# Altium integrated library ubloxLib.IntLib: 111 symbols (part 4 of 4)
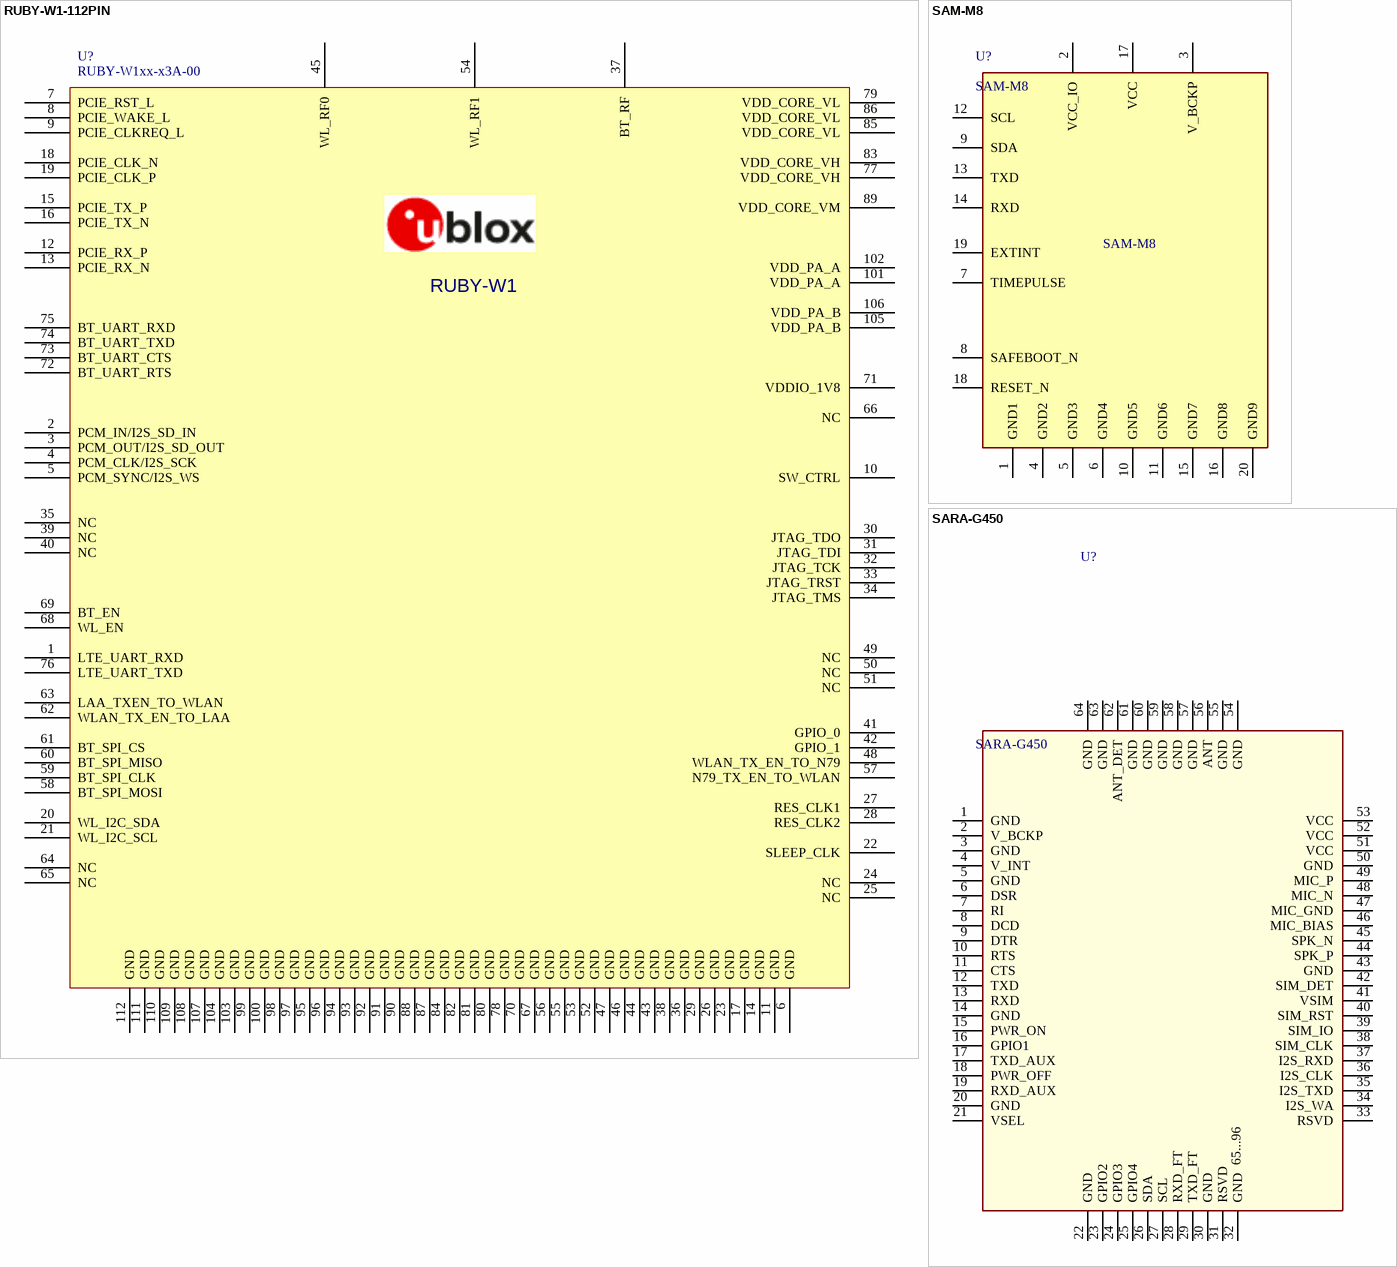
[diagram p27: symbols RUBY-W1-112PIN to SARA-G450]

## RUBY-W1-112PIN
designator U?, comment RUBY-W1xx-x3A-00
LGA-RUBY-W1-112PIN / Host-based automotive module with Wi-Fi 6E and Dual-Mode Bluetooth
footprint RUBY-W1-LGA112PIN (Footrpint for RUBY-W1 - 23.0x23.0 mm)
footprint RUBY-Wx-LGA112PIN_SHARED (Shared footprint for RUBY-W1/RUBY-W2 - 23.0x23.0 mm/23.0x25.0 mm)
pins: 1 LTE_UART_RXD "WSI interface for LTE co-existing interface with LTE modem to enable firmware communication, input signal", 2 PCM_IN/I2S_SD_IN "Bluetooth PCM input signal/I2S_SD_IN,  I2S serial data input", 3 PCM_OUT/I2S_SD_OUT "Bluetooth PCM output signal  Internal 10 kΩ pull-up to VDDIO_1V8 on this pin", 4 PCM_CLK/I2S_SCK "Bluetooth PCM clock signal", 5 PCM_SYNC/I2S_WS "Bluetooth PCM synchronization signal", 6 GND (power), 7 PCIE_RST_L "PCIe host indication to reset the PCIe interface (active low) with weak pull-down", 8 PCIE_WAKE_L "PCIe wake-up signal (active low).   Internal 10 kΩ pull-up to VDDIO_1V8 on this pin", 9 PCIE_CLKREQ_L "PCIe clock request (active low)  Internal 10 kΩ pull-up to VDDIO_1V8 on this pin", 10 SW_CTRL "Switch request to external PMU between active and sleep mode", 11 GND (power), 12 PCIE_RX_P "PCIe positive differential data input", 13 PCIE_RX_N "PCIe negative differential data input", 14 GND (power), 15 PCIE_TX_P "PCIe positive differential data output", 16 PCIE_TX_N "PCIe negative differential data output", 17 GND (power), 18 PCIE_CLK_N "PCIe negative differential clock input", 19 PCIE_CLK_P "PCIe positive differential clock input", 20 WL_I2C_SDA "I2C Master bus Data.   Internal 10 kΩ pull-up to VDDIO_1V8 on this pin.", 21 WL_I2C_SCL "I2C Master bus Clock. The maximum clock rate is 400 kHz. Internal 10 kΩ pull-up to VDDIO_1V8 on this pin.", 22 SLEEP_CLK "External low-power 32.768 kHz clock input. A pull-down resistor is required if SLEEP_CLK is not used.", 23 GND (power), 24 NC, 25 NC, 26 GND (power), 27 RES_CLK1 "Reserved for signal clocking purposes", 28 RES_CLK2 "Reserved for signal clocking purposes", 29 GND (power), 30 JTAG_TDO "JTAG Test Data output. Bootstrap pin, see Table 4 in Datasheet", 31 JTAG_TDI "JTAG Test Data input", 32 JTAG_TCK "JTAG Test Clock", 33 JTAG_TRST "JTAG Test Reset", 34 JTAG_TMS "JTAG Test Mode Select", 35 NC, 36 GND (power), 37 BT_RF "Bluetooth RF input/output (RUBY-W183 only)", 38 GND (power), 39 NC, 40 NC, 41 GPIO_0 "Reserved signal for BSDL purposes  Bootstrap pin, see also Table 4  in Datasheet", 42 GPIO_1 "Reserved signal for BSDL purposes  Bootstrap pin, see also Table 4  in Datasheet", 43 GND (power), 44 GND (power), 45 WL_RF0 "WLAN RF ANT0 input/output for 2.4 GHz, 5/6 GHz (RUBY-W183) and Bluetooth (RUBY-W182)", 46 GND (power), 47 GND (power), 48 WLAN_TX_EN_TO_N79 "5G NR coexistence output signal to indicate 5/6 GHz chains are transmitting above a certain power level, and below a configurable channel frequency", 49 NC, 50 NC, 51 NC, 52 GND (power), 53 GND (power), 54 WL_RF1, 55 GND (power), 56 GND (power), 57 N79_TX_EN_TO_WLAN "5G NR coexistence input signal to indicate when N79 chain is set to transmit above a prescribed RF power", 58 BT_SPI_MOSI "Bluetooth SPI interface   Main Out Sub In (MOSI).  Bootstrap pin, see also Table 4 in Datasheet", 59 BT_SPI_CLK "Bluetooth SPI interface Clock  Internal 10 kΩ pull-up to VDDIO_1V8 on this pin", 60 BT_SPI_MISO "Bluetooth SPI interface  Main In Sub Out (MISO).  Internal 10 kΩ pull-up to VDDIO_1V8 on this pin", 61 BT_SPI_CS "Bluetooth SPI interface Chip select", 62 WLAN_TX_EN_TO_LAA "LTE-LAA coexistence output signal to indicate 5/6GHz chains are transmitting above a certain level", 63 LAA_TXEN_TO_WLAN "LTE-LAA coexistence input signal to indicate when LAA chain is set to transmit above a prescribed RF power", 64 NC, 65 NC, 66 NC, 67 GND (power), 68 WL_EN "WLAN enable signal. Input, active high to enable WLAN operation", 69 BT_EN "Bluetooth enable signal. Input, active high to enable Bluetooth operation", 70 GND (power), 71 VDDIO_1V8 (power) "Voltage for IO, See Table 15 in Datasheet", 72 BT_UART_RTS "Bluetooth UART active-low, request-to-send signal", 73 BT_UART_CTS "Bluetooth UART active-low,  clear-to-send signal", 74 BT_UART_TXD "Bluetooth UART serial data output", 75 BT_UART_RXD "Bluetooth UART serial data input", 76 LTE_UART_TXD "WSI interface for LTE co-existing interface with LTE modem to enable firmware communication, output signal. Bootstrap pin.  See also Table 4 in Datasheet", 77 VDD_CORE_VH (power) "Voltage for Core, high voltage,  See Table 15 in Datasheet", 78 GND (power), 79 VDD_CORE_VL (power) "Voltage for Core, low voltage,  See Table 15 in Datasheet", 80 GND (power), 81 GND (power), 82 GND (power), 83 VDD_CORE_VH (power) "Voltage for Core, high voltage.  See Table 15 in Datasheet", 84 GND (power), 85 VDD_CORE_VL (power) "Voltage for Core, low voltage  See Table 15 in Datasheet", 86 VDD_CORE_VL (power) "Voltage for Core, low voltage  See Table 15 in Datasheet", 87 GND (power), 88 GND (power), 89 VDD_CORE_VM (power) "Voltage for Core, mid voltage.  See Table 15 in Datasheet", 90 GND (power), 91 GND (power), 92 GND (power), 93 GND (power), 94 GND (power), 95 GND (power), 96 GND (power), 97 GND (power), 98 GND (power), 99 GND (power), 100 GND (power), 101 VDD_PA_A (power) "Voltage for PA in module.  See Table 15 in Datasheet", 102 VDD_PA_A (power) "Voltage for PA in module.  See Table 15 in Datasheet", 103 GND (power), 104 GND (power), 105 VDD_PA_B (power) "Voltage for PA in module.  See Table 15 in Datasheet", 106 VDD_PA_B (power) "Voltage for PA in module.  See Table 15 in Datasheet", 107 GND (power), 108 GND (power), 109 GND (power), 110 GND (power), 111 GND (power), 112 GND (power)
text: RUBY-W1

## SAM-M8
designator U?
u-blox SAM GNSS antenna module; Manufacturer: u-blox; Part Description: u-blox SAM GNSS antenna module; Value: SAM-M8
footprint SAM-M8 (ublox SAM antenna module)
pins: 1 GND1, 2 VCC_IO, 3 V_BCKP, 4 GND2, 5 GND3, 6 GND4, 7 TIMEPULSE, 8 SAFEBOOT_N, 9 SDA, 10 GND5, 11 GND6, 12 SCL, 13 TXD, 14 RXD, 15 GND7, 16 GND8, 17 VCC, 18 RESET_N, 19 EXTINT, 20 GND9

## SARA-G450
designator U?
u-blox SARA-RG450 Quad-band GSM/GPRS module; Part Description: GSM/EGPRS/HSPA module; Manufacturer: u-blox; Value: SARA-G450
footprint SARA (GSM/GPRS and GSM/EGPRS/HSPA Cellular Module)
pins: 1 GND, 2 V_BCKP, 3 GND, 4 V_INT, 5 GND, 6 DSR, 7 RI, 8 DCD, 9 DTR, 10 RTS, 11 CTS, 12 TXD, 13 RXD, 14 GND, 15 PWR_ON, 16 GPIO1, 17 TXD_AUX, 18 PWR_OFF, 19 RXD_AUX, 20 GND, 21 VSEL, 22 GND, 23 GPIO2, 24 GPIO3, 25 GPIO4, 26 SDA, 27 SCL, 28 RXD_FT, 29 TXD_FT, 30 GND, 31 RSVD, 32 GND, 33 RSVD, 34 I2S_WA, 35 I2S_TXD, 36 I2S_CLK, 37 I2S_RXD, 38 SIM_CLK, 39 SIM_IO, 40 SIM_RST, 41 VSIM, 42 SIM_DET, 43 GND, 44 SPK_P, 45 SPK_N, 46 MIC_BIAS, 47 MIC_GND, 48 MIC_N, 49 MIC_P, 50 GND, 51 VCC, 52 VCC, 53 VCC, 54 GND, 55 GND, 56 ANT, 57 GND, 58 GND, 59 GND, 60 GND, 61 GND, 62 ANT_DET, 63 GND, 64 GND, 65 GND, 66 GND, 67 GND, 68 GND, 69 GND, 70 GND, 71 GND, 72 GND, 73 GND, 74 GND, 75 GND, 76 GND, 77 GND, 78 GND, 79 GND, 80 GND, 81 GND, 82 GND, 83 GND, 84 GND, 85 GND, 86 GND, 87 GND, 88 GND, 89 GND, 90 GND, 91 GND, 92 GND, 93 GND, 94 GND, 95 GND, 96 GND
text: 65...96

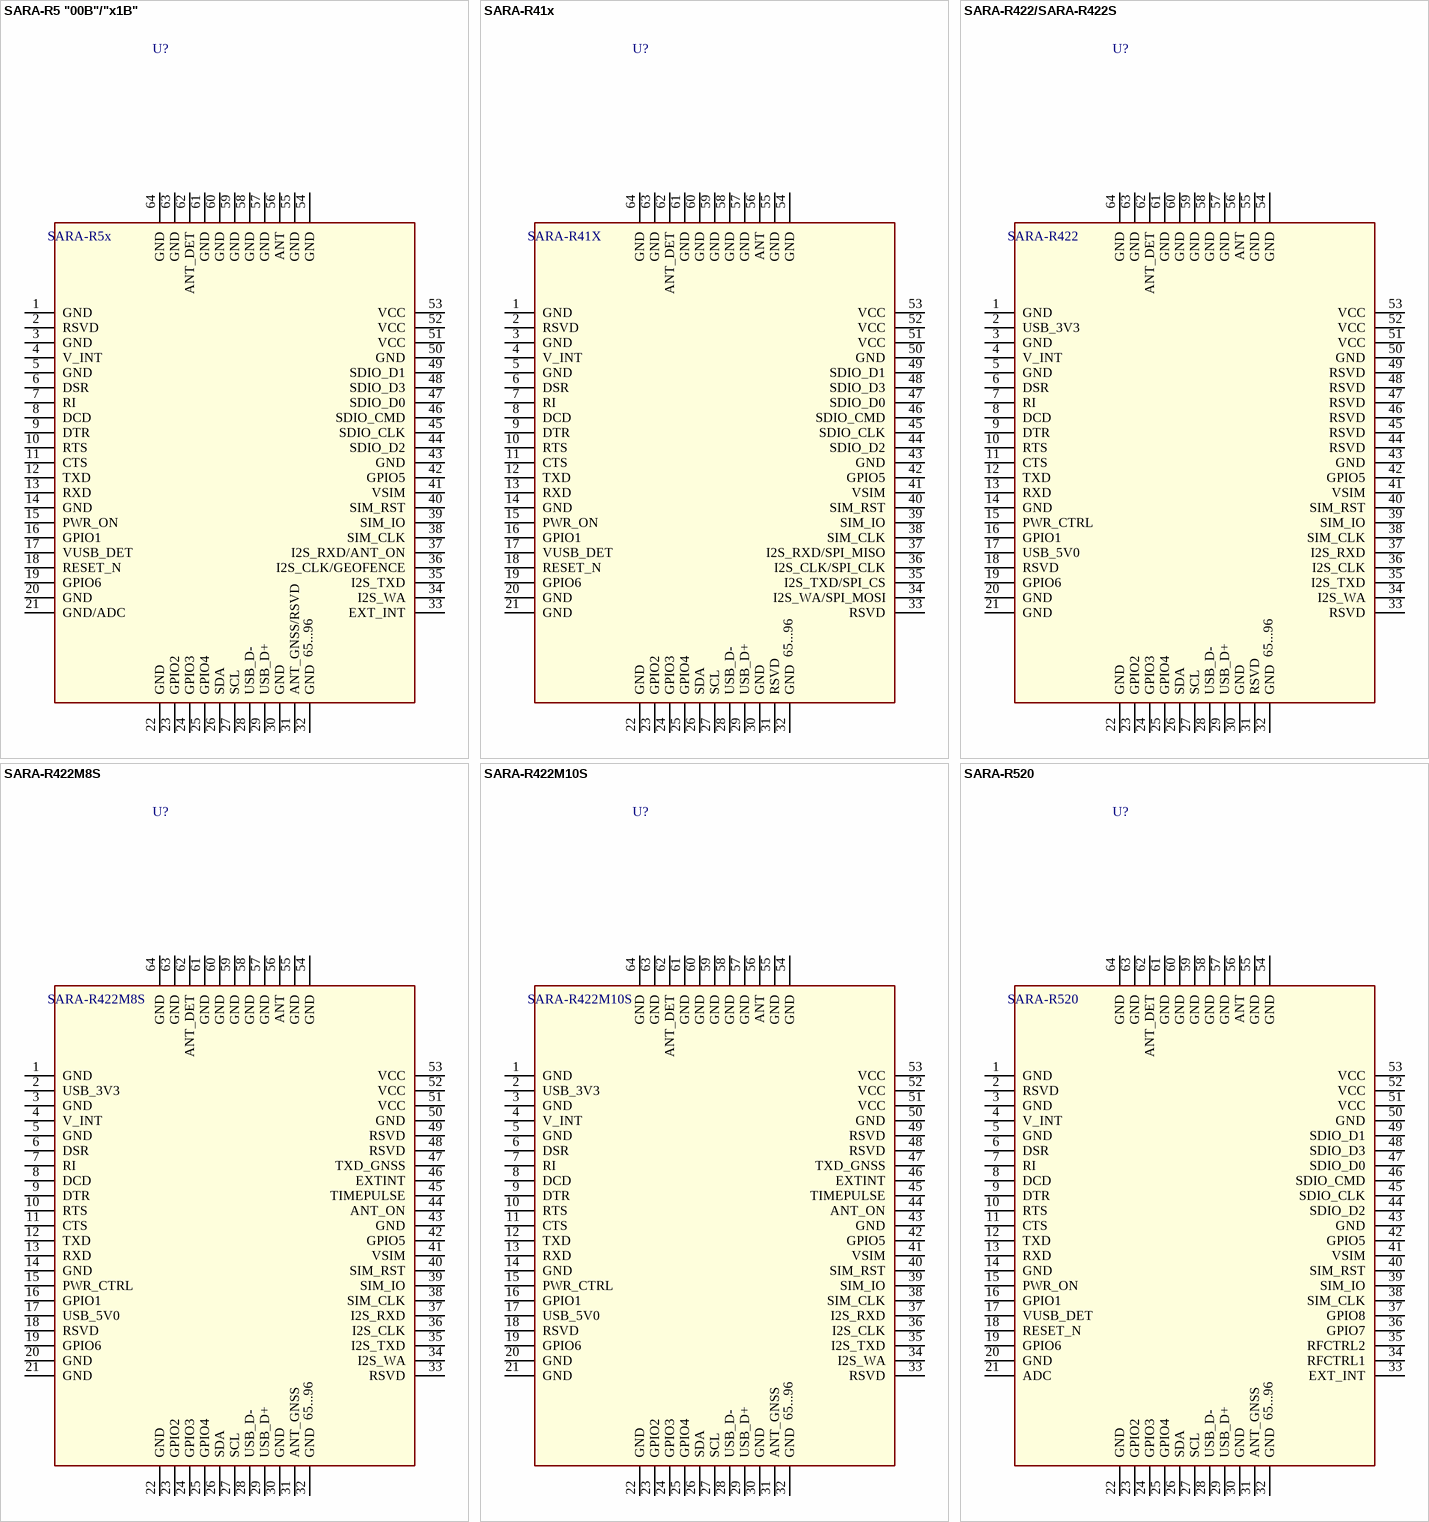
[diagram p22: symbols SARA-R5 "00B"/"x1B" to SARA-R520]

## SARA-R5 "00B"/"x1B"
designator U?, comment SARA-R5x
u-blox SARA-R5 series LTE-M / NB-IoT modules based on UBX-R5 chipset; Part Description: GSM/EGPRS/HSPA module; Manufacturer: u-blox; Value: SARA-R5x
footprint SARA (GSM/GPRS and GSM/EGPRS/HSPA Cellular Module)
pins: 1 GND, 2 RSVD, 3 GND, 4 V_INT, 5 GND, 6 DSR, 7 RI, 8 DCD, 9 DTR, 10 RTS, 11 CTS, 12 TXD, 13 RXD, 14 GND, 15 PWR_ON, 16 GPIO1, 17 VUSB_DET, 18 RESET_N, 19 GPIO6, 20 GND, 21 GND/ADC, 22 GND, 23 GPIO2, 24 GPIO3, 25 GPIO4, 26 SDA, 27 SCL, 28 USB_D-, 29 USB_D+, 30 GND, 31 ANT_GNSS/RSVD, 32 GND, 33 EXT_INT, 34 I2S_WA, 35 I2S_TXD, 36 I2S_CLK/GEOFENCE, 37 I2S_RXD/ANT_ON, 38 SIM_CLK, 39 SIM_IO, 40 SIM_RST, 41 VSIM, 42 GPIO5, 43 GND, 44 SDIO_D2, 45 SDIO_CLK, 46 SDIO_CMD, 47 SDIO_D0, 48 SDIO_D3, 49 SDIO_D1, 50 GND, 51 VCC, 52 VCC, 53 VCC, 54 GND, 55 GND, 56 ANT, 57 GND, 58 GND, 59 GND, 60 GND, 61 GND, 62 ANT_DET, 63 GND, 64 GND, 65 GND, 66 GND, 67 GND, 68 GND, 69 GND, 70 GND, 71 GND, 72 GND, 73 GND, 74 GND, 75 GND, 76 GND, 77 GND, 78 GND, 79 GND, 80 GND, 81 GND, 82 GND, 83 GND, 84 GND, 85 GND, 86 GND, 87 GND, 88 GND, 89 GND, 90 GND, 91 GND, 92 GND, 93 GND, 94 GND, 95 GND, 96 GND
text: 65...96

## SARA-R41x
designator U?, comment SARA-R41X
u-blox SARA-R4 series Multi-band LTE-M / NB-IoT / EGPRS modules; Part Description: GSM/EGPRS/HSPA module; Manufacturer: u-blox; Value: SARA-R41X
footprint SARA (GSM/GPRS and GSM/EGPRS/HSPA Cellular Module)
pins: 1 GND, 2 RSVD, 3 GND, 4 V_INT, 5 GND, 6 DSR, 7 RI, 8 DCD, 9 DTR, 10 RTS, 11 CTS, 12 TXD, 13 RXD, 14 GND, 15 PWR_ON, 16 GPIO1, 17 VUSB_DET, 18 RESET_N, 19 GPIO6, 20 GND, 21 GND, 22 GND, 23 GPIO2, 24 GPIO3, 25 GPIO4, 26 SDA, 27 SCL, 28 USB_D-, 29 USB_D+, 30 GND, 31 RSVD, 32 GND, 33 RSVD, 34 I2S_WA/SPI_MOSI, 35 I2S_TXD/SPI_CS, 36 I2S_CLK/SPI_CLK, 37 I2S_RXD/SPI_MISO, 38 SIM_CLK, 39 SIM_IO, 40 SIM_RST, 41 VSIM, 42 GPIO5, 43 GND, 44 SDIO_D2, 45 SDIO_CLK, 46 SDIO_CMD, 47 SDIO_D0, 48 SDIO_D3, 49 SDIO_D1, 50 GND, 51 VCC, 52 VCC, 53 VCC, 54 GND, 55 GND, 56 ANT, 57 GND, 58 GND, 59 GND, 60 GND, 61 GND, 62 ANT_DET, 63 GND, 64 GND, 65 GND, 66 GND, 67 GND, 68 GND, 69 GND, 70 GND, 71 GND, 72 GND, 73 GND, 74 GND, 75 GND, 76 GND, 77 GND, 78 GND, 79 GND, 80 GND, 81 GND, 82 GND, 83 GND, 84 GND, 85 GND, 86 GND, 87 GND, 88 GND, 89 GND, 90 GND, 91 GND, 92 GND, 93 GND, 94 GND, 95 GND, 96 GND
text: 65...96

## SARA-R422/SARA-R422S
designator U?, comment SARA-R422
u-blox SARA-R4 series Multi-band LTE-M / NB-IoT / EGPRS modules; Part Description: GSM/EGPRS/HSPA module; Manufacturer: u-blox; Value: SARA-R422
footprint SARA (GSM/GPRS and GSM/EGPRS/HSPA Cellular Module)
pins: 1 GND, 2 USB_3V3, 3 GND, 4 V_INT, 5 GND, 6 DSR, 7 RI, 8 DCD, 9 DTR, 10 RTS, 11 CTS, 12 TXD, 13 RXD, 14 GND, 15 PWR_CTRL, 16 GPIO1, 17 USB_5V0, 18 RSVD, 19 GPIO6, 20 GND, 21 GND, 22 GND, 23 GPIO2, 24 GPIO3, 25 GPIO4, 26 SDA, 27 SCL, 28 USB_D-, 29 USB_D+, 30 GND, 31 RSVD, 32 GND, 33 RSVD, 34 I2S_WA, 35 I2S_TXD, 36 I2S_CLK, 37 I2S_RXD, 38 SIM_CLK, 39 SIM_IO, 40 SIM_RST, 41 VSIM, 42 GPIO5, 43 GND, 44 RSVD, 45 RSVD, 46 RSVD, 47 RSVD, 48 RSVD, 49 RSVD, 50 GND, 51 VCC, 52 VCC, 53 VCC, 54 GND, 55 GND, 56 ANT, 57 GND, 58 GND, 59 GND, 60 GND, 61 GND, 62 ANT_DET, 63 GND, 64 GND, 65 GND, 66 GND, 67 GND, 68 GND, 69 GND, 70 GND, 71 GND, 72 GND, 73 GND, 74 GND, 75 GND, 76 GND, 77 GND, 78 GND, 79 GND, 80 GND, 81 GND, 82 GND, 83 GND, 84 GND, 85 GND, 86 GND, 87 GND, 88 GND, 89 GND, 90 GND, 91 GND, 92 GND, 93 GND, 94 GND, 95 GND, 96 GND
text: 65...96

## SARA-R422M8S
designator U?
u-blox SARA-R4 series Multi-band LTE-M / NB-IoT / EGPRS modules; Part Description: GSM/EGPRS/HSPA module; Manufacturer: u-blox; Value: SARA-R422M8S
footprint SARA (GSM/GPRS and GSM/EGPRS/HSPA Cellular Module)
pins: 1 GND, 2 USB_3V3, 3 GND, 4 V_INT, 5 GND, 6 DSR, 7 RI, 8 DCD, 9 DTR, 10 RTS, 11 CTS, 12 TXD, 13 RXD, 14 GND, 15 PWR_CTRL, 16 GPIO1, 17 USB_5V0, 18 RSVD, 19 GPIO6, 20 GND, 21 GND, 22 GND, 23 GPIO2, 24 GPIO3, 25 GPIO4, 26 SDA, 27 SCL, 28 USB_D-, 29 USB_D+, 30 GND, 31 ANT_GNSS, 32 GND, 33 RSVD, 34 I2S_WA, 35 I2S_TXD, 36 I2S_CLK, 37 I2S_RXD, 38 SIM_CLK, 39 SIM_IO, 40 SIM_RST, 41 VSIM, 42 GPIO5, 43 GND, 44 ANT_ON, 45 TIMEPULSE, 46 EXTINT, 47 TXD_GNSS, 48 RSVD, 49 RSVD, 50 GND, 51 VCC, 52 VCC, 53 VCC, 54 GND, 55 GND, 56 ANT, 57 GND, 58 GND, 59 GND, 60 GND, 61 GND, 62 ANT_DET, 63 GND, 64 GND, 65 GND, 66 GND, 67 GND, 68 GND, 69 GND, 70 GND, 71 GND, 72 GND, 73 GND, 74 GND, 75 GND, 76 GND, 77 GND, 78 GND, 79 GND, 80 GND, 81 GND, 82 GND, 83 GND, 84 GND, 85 GND, 86 GND, 87 GND, 88 GND, 89 GND, 90 GND, 91 GND, 92 GND, 93 GND, 94 GND, 95 GND, 96 GND
text: 65...96

## SARA-R422M10S
designator U?
u-blox SARA-R4 series Multi-band LTE-M / NB-IoT / EGPRS modules; Part Description: GSM/EGPRS/HSPA module; Manufacturer: u-blox; Value: SARA-R422M10S
footprint SARA (GSM/GPRS and GSM/EGPRS/HSPA Cellular Module)
pins: 1 GND, 2 USB_3V3, 3 GND, 4 V_INT, 5 GND, 6 DSR, 7 RI, 8 DCD, 9 DTR, 10 RTS, 11 CTS, 12 TXD, 13 RXD, 14 GND, 15 PWR_CTRL, 16 GPIO1, 17 USB_5V0, 18 RSVD, 19 GPIO6, 20 GND, 21 GND, 22 GND, 23 GPIO2, 24 GPIO3, 25 GPIO4, 26 SDA, 27 SCL, 28 USB_D-, 29 USB_D+, 30 GND, 31 ANT_GNSS, 32 GND, 33 RSVD, 34 I2S_WA, 35 I2S_TXD, 36 I2S_CLK, 37 I2S_RXD, 38 SIM_CLK, 39 SIM_IO, 40 SIM_RST, 41 VSIM, 42 GPIO5, 43 GND, 44 ANT_ON, 45 TIMEPULSE, 46 EXTINT, 47 TXD_GNSS, 48 RSVD, 49 RSVD, 50 GND, 51 VCC, 52 VCC, 53 VCC, 54 GND, 55 GND, 56 ANT, 57 GND, 58 GND, 59 GND, 60 GND, 61 GND, 62 ANT_DET, 63 GND, 64 GND, 65 GND, 66 GND, 67 GND, 68 GND, 69 GND, 70 GND, 71 GND, 72 GND, 73 GND, 74 GND, 75 GND, 76 GND, 77 GND, 78 GND, 79 GND, 80 GND, 81 GND, 82 GND, 83 GND, 84 GND, 85 GND, 86 GND, 87 GND, 88 GND, 89 GND, 90 GND, 91 GND, 92 GND, 93 GND, 94 GND, 95 GND, 96 GND
text: 65...96

## SARA-R520
designator U?
u-blox SARA-R52 series LTE-M / NB-IoT modules based on UBX-R5 chipset; Part Description: GSM/EGPRS/HSPA module; Manufacturer: u-blox; Value: SARA-R520
footprint SARA (GSM/GPRS and GSM/EGPRS/HSPA Cellular Module)
pins: 1 GND, 2 RSVD, 3 GND, 4 V_INT, 5 GND, 6 DSR, 7 RI, 8 DCD, 9 DTR, 10 RTS, 11 CTS, 12 TXD, 13 RXD, 14 GND, 15 PWR_ON, 16 GPIO1, 17 VUSB_DET, 18 RESET_N, 19 GPIO6, 20 GND, 21 ADC, 22 GND, 23 GPIO2, 24 GPIO3, 25 GPIO4, 26 SDA, 27 SCL, 28 USB_D-, 29 USB_D+, 30 GND, 31 ANT_GNSS, 32 GND, 33 EXT_INT, 34 RFCTRL1, 35 RFCTRL2, 36 GPIO7, 37 GPIO8, 38 SIM_CLK, 39 SIM_IO, 40 SIM_RST, 41 VSIM, 42 GPIO5, 43 GND, 44 SDIO_D2, 45 SDIO_CLK, 46 SDIO_CMD, 47 SDIO_D0, 48 SDIO_D3, 49 SDIO_D1, 50 GND, 51 VCC, 52 VCC, 53 VCC, 54 GND, 55 GND, 56 ANT, 57 GND, 58 GND, 59 GND, 60 GND, 61 GND, 62 ANT_DET, 63 GND, 64 GND, 65 GND, 66 GND, 67 GND, 68 GND, 69 GND, 70 GND, 71 GND, 72 GND, 73 GND, 74 GND, 75 GND, 76 GND, 77 GND, 78 GND, 79 GND, 80 GND, 81 GND, 82 GND, 83 GND, 84 GND, 85 GND, 86 GND, 87 GND, 88 GND, 89 GND, 90 GND, 91 GND, 92 GND, 93 GND, 94 GND, 95 GND, 96 GND
text: 65...96

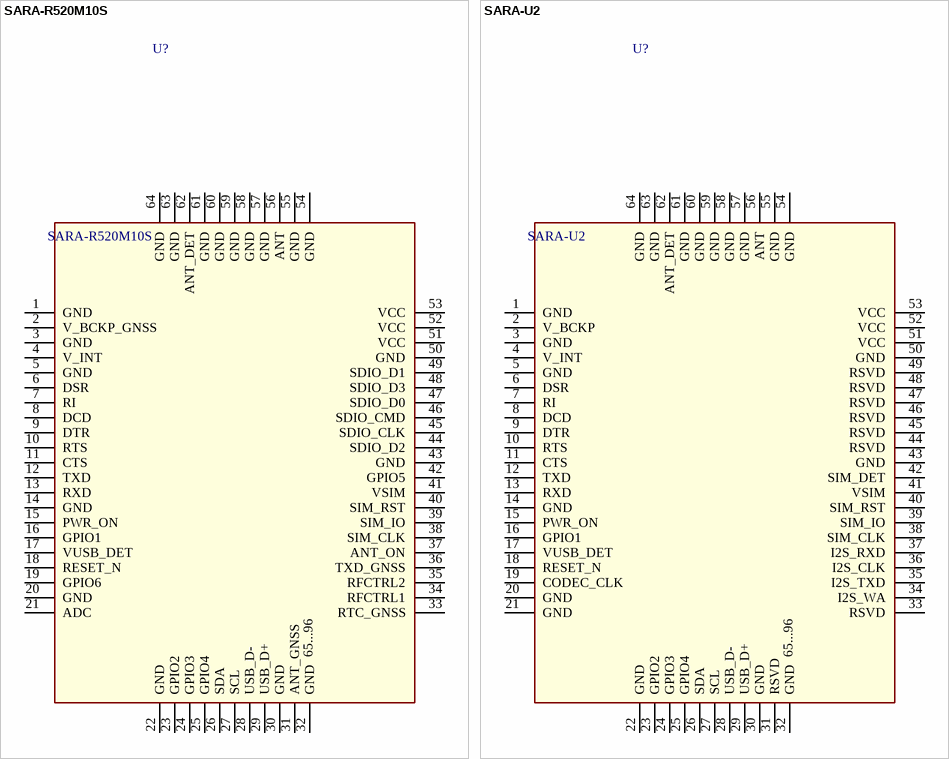
[diagram p23: symbols SARA-R520M10S to SARA-U2]

## SARA-R520M10S
designator U?
u-blox SARA-R52 series LTE-M / NB-IoT modules based on UBX-R5 chipset; Part Description: GSM/EGPRS/HSPA module; Manufacturer: u-blox; Value: SARA-R520M10S
footprint SARA (GSM/GPRS and GSM/EGPRS/HSPA Cellular Module)
pins: 1 GND, 2 V_BCKP_GNSS, 3 GND, 4 V_INT, 5 GND, 6 DSR, 7 RI, 8 DCD, 9 DTR, 10 RTS, 11 CTS, 12 TXD, 13 RXD, 14 GND, 15 PWR_ON, 16 GPIO1, 17 VUSB_DET, 18 RESET_N, 19 GPIO6, 20 GND, 21 ADC, 22 GND, 23 GPIO2, 24 GPIO3, 25 GPIO4, 26 SDA, 27 SCL, 28 USB_D-, 29 USB_D+, 30 GND, 31 ANT_GNSS, 32 GND, 33 RTC_GNSS, 34 RFCTRL1, 35 RFCTRL2, 36 TXD_GNSS, 37 ANT_ON, 38 SIM_CLK, 39 SIM_IO, 40 SIM_RST, 41 VSIM, 42 GPIO5, 43 GND, 44 SDIO_D2, 45 SDIO_CLK, 46 SDIO_CMD, 47 SDIO_D0, 48 SDIO_D3, 49 SDIO_D1, 50 GND, 51 VCC, 52 VCC, 53 VCC, 54 GND, 55 GND, 56 ANT, 57 GND, 58 GND, 59 GND, 60 GND, 61 GND, 62 ANT_DET, 63 GND, 64 GND, 65 GND, 66 GND, 67 GND, 68 GND, 69 GND, 70 GND, 71 GND, 72 GND, 73 GND, 74 GND, 75 GND, 76 GND, 77 GND, 78 GND, 79 GND, 80 GND, 81 GND, 82 GND, 83 GND, 84 GND, 85 GND, 86 GND, 87 GND, 88 GND, 89 GND, 90 GND, 91 GND, 92 GND, 93 GND, 94 GND, 95 GND, 96 GND
text: 65...96

## SARA-U2
designator U?
SARA-U2 series HSPA modules with 2G fallback; Manufacturer: u-blox; Part Description: GSM/EGPRS/HSPA module; Value: SARA-U2
footprint SARA (GSM/GPRS and GSM/EGPRS/HSPA Cellular Module)
pins: 1 GND, 2 V_BCKP, 3 GND, 4 V_INT, 5 GND, 6 DSR, 7 RI, 8 DCD, 9 DTR, 10 RTS, 11 CTS, 12 TXD, 13 RXD, 14 GND, 15 PWR_ON, 16 GPIO1, 17 VUSB_DET, 18 RESET_N, 19 CODEC_CLK, 20 GND, 21 GND, 22 GND, 23 GPIO2, 24 GPIO3, 25 GPIO4, 26 SDA, 27 SCL, 28 USB_D-, 29 USB_D+, 30 GND, 31 RSVD, 32 GND, 33 RSVD, 34 I2S_WA, 35 I2S_TXD, 36 I2S_CLK, 37 I2S_RXD, 38 SIM_CLK, 39 SIM_IO, 40 SIM_RST, 41 VSIM, 42 SIM_DET, 43 GND, 44 RSVD, 45 RSVD, 46 RSVD, 47 RSVD, 48 RSVD, 49 RSVD, 50 GND, 51 VCC, 52 VCC, 53 VCC, 54 GND, 55 GND, 56 ANT, 57 GND, 58 GND, 59 GND, 60 GND, 61 GND, 62 ANT_DET, 63 GND, 64 GND, 65 GND, 66 GND, 67 GND, 68 GND, 69 GND, 70 GND, 71 GND, 72 GND, 73 GND, 74 GND, 75 GND, 76 GND, 77 GND, 78 GND, 79 GND, 80 GND, 81 GND, 82 GND, 83 GND, 84 GND, 85 GND, 86 GND, 87 GND, 88 GND, 89 GND, 90 GND, 91 GND, 92 GND, 93 GND, 94 GND, 95 GND, 96 GND
text: 65...96

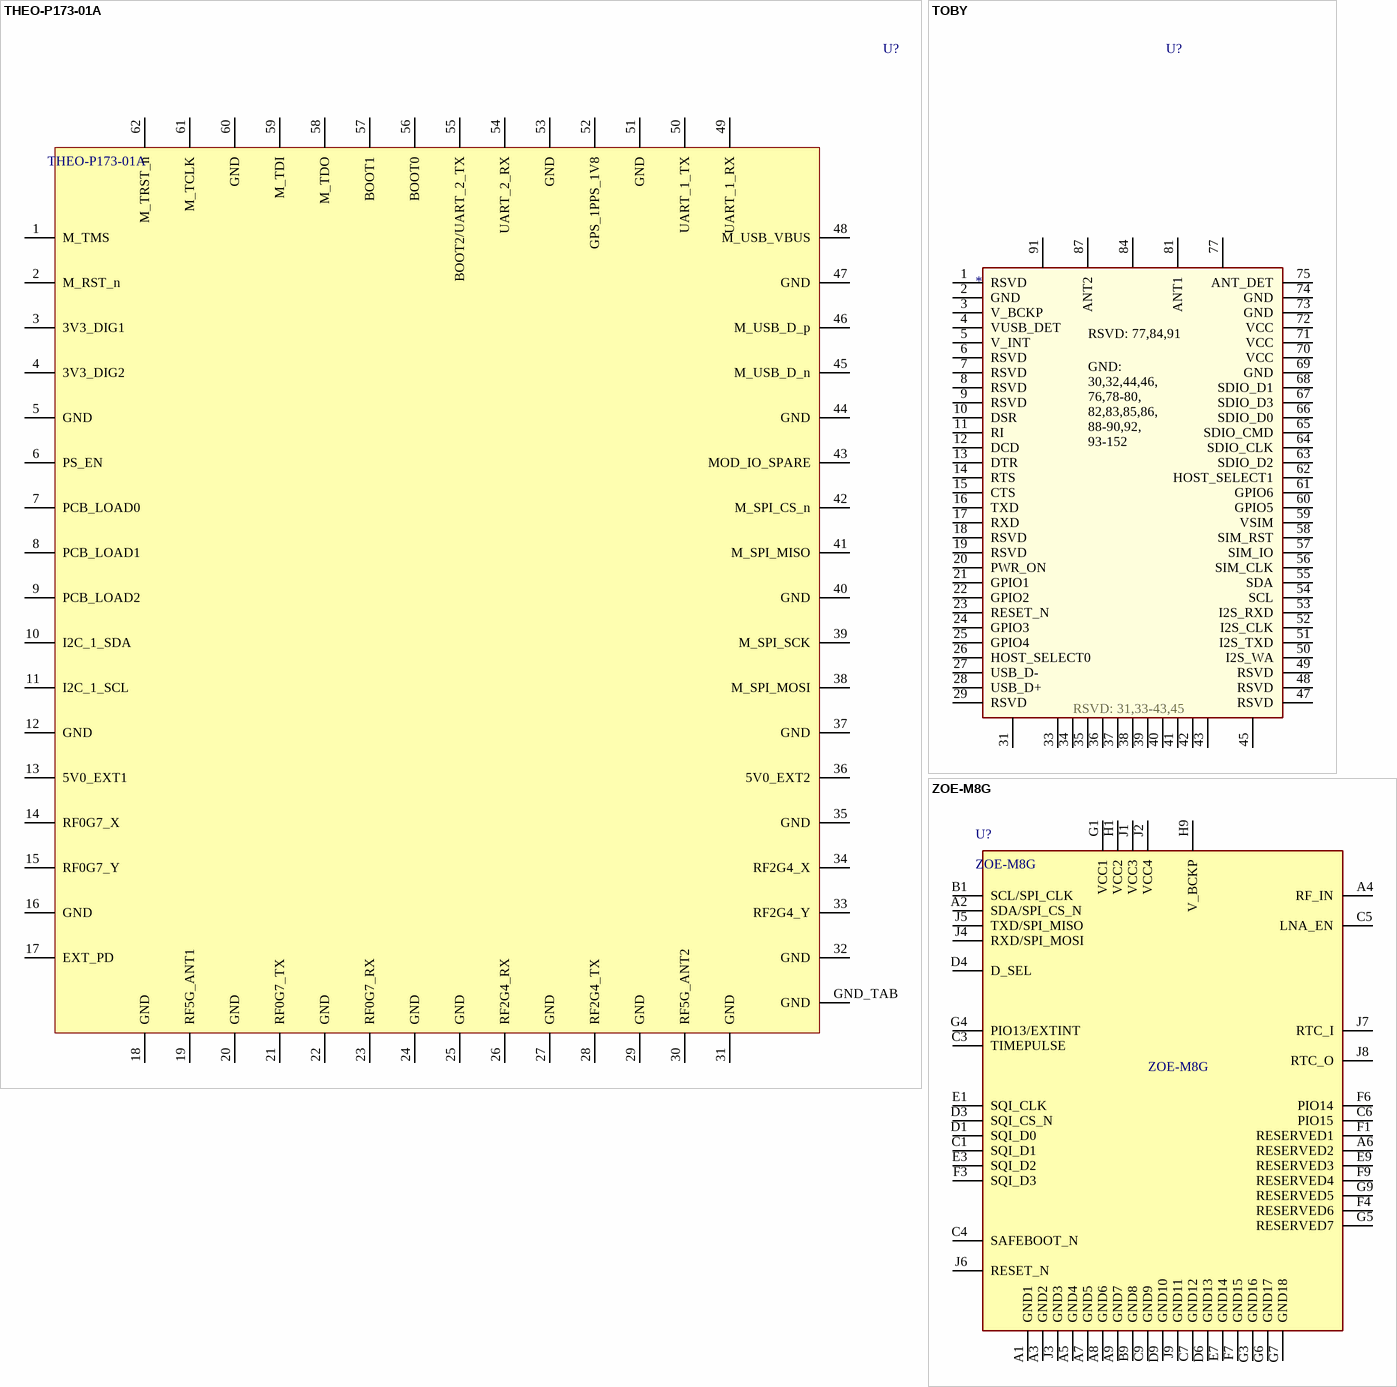
[diagram p24: symbols THEO-P173-01A to ZOE-M8G]

## THEO-P173-01A
designator U?
u-blox THEO-P173 host-based V2X transceiver module; Part Description: Host-based V2X transceiver module; Manufacturer: u-blox; Value: THEO-P173-01A
footprint THEO-P173-01A (Host-based V2X transceiver module)
pins: 1 M_TMS, 2 M_RST_n, 3 3V3_DIG1 (power), 4 3V3_DIG2 (power), 5 GND (power), 6 PS_EN, 7 PCB_LOAD0, 8 PCB_LOAD1, 9 PCB_LOAD2, 10 I2C_1_SDA, 11 I2C_1_SCL, 12 GND (power), 13 5V0_EXT1 (power), 14 RF0G7_X, 15 RF0G7_Y, 16 GND (power), 17 EXT_PD (power), 18 GND (power), 19 RF5G_ANT1, 20 GND (power), 21 RF0G7_TX, 22 GND (power), 23 RF0G7_RX, 24 GND (power), 25 GND (power), 26 RF2G4_RX, 27 GND (power), 28 RF2G4_TX, 29 GND (power), 30 RF5G_ANT2, 31 GND (power), 32 GND (power), 33 RF2G4_Y, 34 RF2G4_X, 35 GND (power), 36 5V0_EXT2 (power), 37 GND (power), 38 M_SPI_MOSI, 39 M_SPI_SCK, 40 GND (power), 41 M_SPI_MISO, 42 M_SPI_CS_n, 43 MOD_IO_SPARE, 44 GND (power), 45 M_USB_D_n, 46 M_USB_D_p, 47 GND (power), 48 M_USB_VBUS, 49 UART_1_RX, 50 UART_1_TX, 51 GND (power), 52 GPS_1PPS_1V8, 53 GND (power), 54 UART_2_RX, 55 BOOT2/UART_2_TX, 56 BOOT0, 57 BOOT1, 58 M_TDO, 59 M_TDI, 60 GND (power), 61 M_TCLK, 62 M_TRST_n, GND_TAB GND (power)

## TOBY
designator U?
u-blox TOBY cellular modems; Manufacturer: u-blox; Part Manufacturer: *; Value: *
footprint TOBY (TOBY cellular module)
pins: 1 RSVD, 2 GND, 3 V_BCKP, 4 VUSB_DET, 5 V_INT, 6 RSVD, 7 RSVD, 8 RSVD, 9 RSVD, 10 DSR, 11 RI, 12 DCD, 13 DTR, 14 RTS, 15 CTS, 16 TXD, 17 RXD, 18 RSVD, 19 RSVD, 20 PWR_ON, 21 GPIO1, 22 GPIO2, 23 RESET_N, 24 GPIO3, 25 GPIO4, 26 HOST_SELECT0, 27 USB_D-, 28 USB_D+, 29 RSVD, 30 GND, 31 RSVD, 32 GND, 33 RSVD, 34 RSVD, 35 RSVD, 36 RSVD, 37 RSVD, 38 RSVD, 39 RSVD, 40 RSVD, 41 RSVD, 42 RSVD, 43 RSVD, 44, 45 RSVD, 46, 47 RSVD, 48 RSVD, 49 RSVD, 50 I2S_WA, 51 I2S_TXD, 52 I2S_CLK, 53 I2S_RXD, 54 SCL, 55 SDA, 56 SIM_CLK, 57 SIM_IO, 58 SIM_RST, 59 VSIM, 60 GPIO5, 61 GPIO6, 62 HOST_SELECT1, 63 SDIO_D2, 64 SDIO_CLK, 65 SDIO_CMD, 66 SDIO_D0, 67 SDIO_D3, 68 SDIO_D1, 69 GND, 70 VCC, 71 VCC, 72 VCC, 73 GND, 74 GND, 75 ANT_DET, 76 155, 77 RSVD, 78 156, 79 GND, 80 GND, 81 ANT1, 82 44, 83 46, 84 RSVD, 85 155, 86 156, 87 ANT2, 88 157, 89 157, 90 157, 91 RSVD, 92 GND, 93 GND, 94 GND, 95 GND, 96 GND, 97 GND, 98 GND, 99 GND, 100 GND, 101 GND, 102 GND, 103 GND, 104 GND, 105 GND, 106 GND, 107 GND, 108 GND, 109 GND, 110 GND, 111 GND, 112 GND, 113 GND, 114 GND, 115 GND, 116 GND, 117 GND, 118 GND, 119 GND, 120 GND, 121 GND, 122 GND, 123 GND, 124 GND, 125 GND, 126 GND, 127 GND, 128 GND, 129 GND, 130 GND, 131 GND, 132 GND, 133 GND, 134 GND, 135 GND, 136 GND, 137 GND, 138 GND, 139 GND, 140 GND, 141 GND, 142 GND, 143 GND, 144 GND, 145 GND, 146 GND, 147 GND, 148 GND, 149 GND, 150 GND, 151 GND, 152 GND
text: RSVD: 77,84,91; GND: / 30,32,44,46, / 76,78-80, / 82,83,85,86, / 88-90,92, / 93-152; RSVD: 31,33-43,45

## ZOE-M8G
designator U?
u-blox ZOE GNSS module; Part Description: u-blox ZOE-M8G GNSS module; Manufacturer: u-blox; Value: ZOE-M8G
footprint ZOE-M8G
pins: A1 GND1, A2 SDA/SPI_CS_N, A3 GND2, A4 RF_IN, A5 GND4, A6 RESERVED2, A7 GND5, A8 GND6, A9 GND7, B1 SCL/SPI_CLK, B9 GND8, C1 SQI_D1, C3 TIMEPULSE, C4 SAFEBOOT_N, C5 LNA_EN, C6 PIO15, C7 GND12, C9 GND9, D1 SQI_D0, D3 SQI_CS_N, D4 D_SEL, D6 GND13, D9 GND10, E1 SQI_CLK, E3 SQI_D2, E7 GND14, E9 RESERVED3, F1 RESERVED1, F3 SQI_D3, F4 RESERVED6, F6 PIO14, F7 GND15, F9 RESERVED4, G1 VCC1, G3 GND16, G4 PIO13/EXTINT, G5 RESERVED7, G6 GND17, G7 GND18, G9 RESERVED5, H1 VCC2, H9 V_BCKP, J1 VCC3, J2 VCC4, J3 GND3, J4 RXD/SPI_MOSI, J5 TXD/SPI_MISO, J6 RESET_N, J7 RTC_I, J8 RTC_O, J9 GND11